# Altium footprint library TO系列封装.PcbLib: 129 footprints (part 3 of 9)
Each footprint in its own frame and in the unit in brackets; x right, y up, seen from the top. Pads: shape width x height; smd on the part's side, far side on the other; paste and mask are expansions set on the pad; w line width, h text height; cw(c..) or ccw(c..) is an arc to the next point about the centre after c.
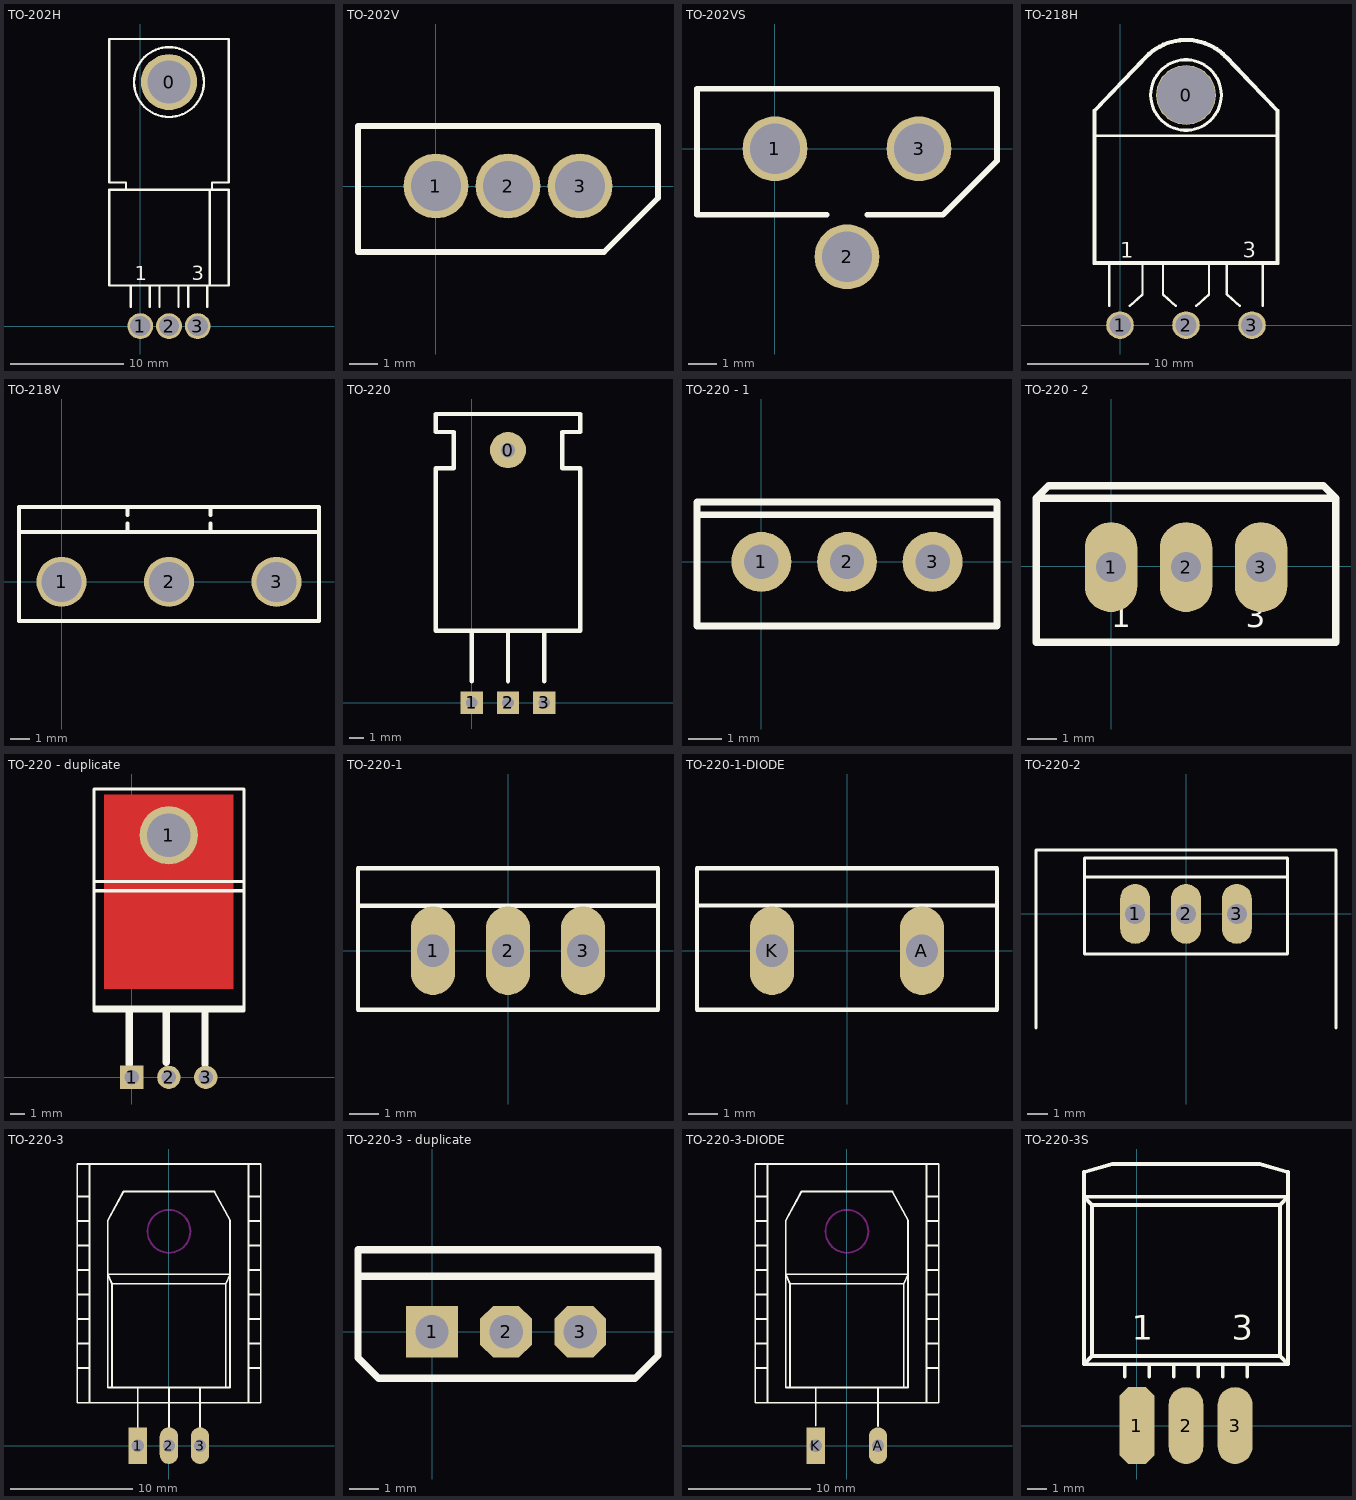
[diagram p2: the footprints below, top view; thin cyan lines are the x and y axes]

## TO-202H [mil]
pads (4):
  round 195 hole 150: 0(100,850)
  round 90 hole 70: 1(0,0) 2(100,0) 3(200,0)
Top Overlay:
  circle w7.87: c100,850 r121.66
  lines w7.87: -50,475 -50,500 -108.33,500 -108.33,1000 308.33,1000 308.33,500 250,500 250,475 ; -33.33,66.93 -33.33,141.67 ; 33.33,66.93 33.33,141.67 ; 66.67,66.93 66.67,141.67 ; 133.33,66.93 133.33,141.67 ; 166.67,66.93 166.67,141.67 ; 233.33,66.93 233.33,141.67 ; 241.67,141.67 241.67,475 ; -108.33,141.67 -108.33,475 308.33,475 308.33,141.67 -108.33,141.67
  text "1" at -20,160 h50
  text "3" at 180,160 h50

## TO-202V [mil]
pads (3):
  round 90 hole 70: 1(0,0) 2(100,0) 3(200,0)
Top Overlay:
  lines w7.87: -108.33,-91.67 233.33,-91.67 308.33,-16.67 308.33,83.33 -108.33,83.33 -108.33,-91.67

## TO-202VS [mil]
pads (3):
  round 90 hole 70: 1(0,0) 2(100,-150) 3(200,0)
Top Overlay:
  lines w7.87: -108.33,-91.67 72.04,-91.67 ; 127.96,-91.67 233.33,-91.67
  lines w8: -108.33,-91.67 -108.33,83.33 308.33,83.33 308.33,-16.67 233.33,-91.67

## TO-218H [mil]
pads (4):
  round 195 hole 190: 0(215,750)
  round 90 hole 70: 1(0,0) 2(215,0) 3(430,0)
Top Overlay:
  circle w10: c215,750 r115
  lines w7.87: -35,62.99 -35,200 ; 31.67,62.99 73.33,100 73.33,200 ; 73.33,866.67 -85,700 -85,616.67 ; 95,880 -80,700 -80,205 510,205 510,700 340,875 ; 140,200 140,100 181.67,62.99 ; 248.33,62.99 290,100 290,200 ; 348.33,200 348.33,100 390,62.99 ; 348.33,875 515,700 515,616.67 ; 465,62.99 465,200 ; -85,616.67 -85,200 515,200 515,616.67 ; -85,616.67 515,616.67
  lines w8: 73.17,864.85 cw(c215,750) 348.47,874.46 ; 94.51,879.21 cw(c215,750) 339.92,874.92
  text "3" at 400,220 h50
  text "1" at 0,220 h50
3D body "User Library-TO218.STEP": height 196.09, standoff 7.11, extent -85,-31.61 505.55,961.61

## TO-218V [mil]
pads (3):
  round 100 hole 80: 1(0,0) 2(215,0) 3(430,0)
Top Overlay:
  lines w7.87: -85,100 515,100 ; 131.67,100 131.67,116.67 ; 131.67,133.33 131.67,150 ; 298.33,100 298.33,116.67 ; 298.33,133.33 298.33,150 ; -85,-78.74 -85,150 515,150 515,-78.74 -85,-78.74
3D body "SW3dPS-TO-218-1.STEP": height 1048.11, standoff -322.98, extent -94.21,-82.91 504.21,110

## TO-220 [mil]
pads (4):
  round 100 hole 40: 0(100,700)
  rect 62x62 hole 32: 1(0,0) 2(100,0) 3(200,0)
Top Overlay:
  lines w12: 0,60 0,200 ; 100,60 100,200 ; 200,60 200,200 ; -100,200 -100,650 -50,650 -50,750 -100,750 -100,800 300,800 300,750 250,750 250,650 300,650 300,200 -100,200
3D body "User Library-TO220 L.STEP": height 177.17, standoff -118.11, extent -98.7,-2.88 295,772.88

## TO-220 - 1 [mil]
pads (3):
  round 70 hole 40: 1(0,0) 2(100,0) 3(200,0)
Top Overlay:
  lines w8: -75,55 275,55 ; -75,-75 -75,70 275,70 275,-75 -75,-75

## TO-220 - 2 [mil]
pads (3):
  oval 70x120 hole 40: 1(0,-1) 2(100,-1) 3(200,-1)
Top Overlay:
  lines w10: -100,90.67 -100,-100.56 -99.56,-101 299.56,-101 300,-100.56 300,90.67 ; -100,90.67 300,90.67 ; -100,90.67 -83.33,107.33 283.33,107.33 300,90.67
  text "3" at 180,-81 h30
  text "1" at 0,-81 h30
3D body "User Library-TO-220-1.STEP": height 740.16, standoff -392.91, extent -93.88,-84 295.88,93.17

## TO-220 - duplicate [mm]
pads (4):
  rect 1.6x1.6 hole 1: 1(0,0)
  round 4 hole 3: 1(2.54,16.637)
  round 1.6 hole 1: 2(2.54,0) 3(5.08,0)
Top Layer:
  rectangle: -1.905,6.071 6.985,19.431
Top Overlay:
  lines w0.22: -2.591,4.699 7.696,4.699 ; -2.591,4.826 7.696,4.826 ; -2.591,12.827 7.696,12.827 ; -2.591,13.462 7.696,13.462 ; -2.591,19.05 -2.591,19.812 7.696,19.812 7.696,4.572 -2.591,4.572 -2.591,19.558
  lines w0.5: -0.178,0.889 -0.178,4.572 ; 2.362,1.016 2.362,4.699 ; 5.029,0.889 5.029,4.572
3D body "User Library-TO220 L.STEP": height 4.5, standoff -3, extent -2.46,-0.254 7.54,19.45
3D body "User Library-TO220 L.STEP": height 4.5, standoff -3, extent -2.638,-0.127 7.362,19.577

## TO-220-1 [mm]
pads (3):
  oval 1.5x3 hole 1.1: 1(-2.54,0) 2(0,0) 3(2.54,0)
Top Overlay:
  lines w0.15: -5.08,1.524 5.08,1.521 ; -5.08,-2 -5.08,2.79 5.08,2.79 5.08,-2 -5.08,-2
3D body "IC1.STEP": height 19.5, standoff -4, extent -5.25,-1.955 5.25,2.745
3D body "User Library-POWER MOSFET, NON-SURFACE-MOUNT.step": height 18.3, standoff -10.08, extent -4.834,-1.996 4.818,2.504

## TO-220-1-DIODE [mm]
pads (2):
  oval 1.5x3 hole 1.1: A(2.54,0) K(-2.54,0)
Top Overlay:
  lines w0.15: -5.08,1.53 5.08,1.53 ; -5.08,-2 -5.08,2.79 5.08,2.79 5.08,-2 -5.08,-2
3D body "IC2.STEP": height 19.5, standoff -4, extent -5.25,-1.955 5.25,2.745

## TO-220-2 [mm]
pads (3):
  oval 1.5x3 hole 1: 1(-2.54,0) 2(0,0) 3(2.54,0)
Top Overlay:
  lines w0.15: -7.5,-5.713 -7.5,3.2 7.5,3.2 7.5,-5.713 ; -5.08,1.848 5.08,1.848 ; -5.08,-2 5.08,-2 5.08,2.79 -5.08,2.79 -5.08,-2
3D body "User Library-Package T0-220AB With Heatsing Vertical Mount-1.STEP": height 20.07, standoff -5.86, extent -8.5,-5.787 8.5,4.433

## TO-220-3 [mm]
pads (3):
  rect 1.5x3 hole 1: 1(-2.54,0)
  oval 1.5x3 hole 1: 2(0,0) 3(2.54,0)
Top Overlay:
  lines w0.15: -7.493,6.343 -6.493,6.343 ; -7.493,8.343 -6.493,8.343 ; -7.493,10.343 -6.493,10.343 ; -7.493,12.343 -6.493,12.343 ; -7.493,14.343 -6.493,14.343 ; -7.493,16.343 -6.493,16.343 ; -7.493,18.343 -6.493,18.343 ; -7.493,20.343 -6.493,20.343 ; -6.493,3.505 -6.493,23.005 ; -5,14 5,14 ; -5,14.005 -4.644,13.217 ; -5,18.377 -5,4.75 5,4.75 5,18.377 ; -5,18.388 -3.712,20.75 3.712,20.75 5,18.388 ; -4.644,4.75 -4.644,13.217 ; -2.54,0 -2.54,4.75 ; 0,0 0,4.75 ; 2.54,0 2.54,4.75 ; 4.644,4.75 4.644,13.217 ; 5,14.005 4.644,13.217 ; 6.507,3.505 6.507,23.005 ; 6.507,6.343 7.507,6.343 ; 6.507,8.343 7.507,8.343 ; 6.507,10.343 7.507,10.343 ; 6.507,12.343 7.507,12.343 ; 6.507,14.343 7.507,14.343 ; 6.507,16.343 7.507,16.343 ; 6.507,18.343 7.507,18.343 ; 6.507,20.343 7.507,20.343 ; -4.644,13.217 4.644,13.217 ; -7.493,3.505 7.507,3.505 7.507,23.005 -7.493,23.005 -7.493,3.505
Keep-Out Layer:
  circle w0.15: c0.007,17.505 r1.75
  circle w0.15: c0,17.5 r1.75
3D body "User Library-TO-220-2.step": height 10.39, standoff -2.31, extent -5.85,-0.325 5.864,21.773

## TO-220-3 - duplicate [mil]
pads (3):
  rect 70x70 hole 45: 1(0,0)
  oct 70x70 hole 45: 2(100,0) 3(200,0)
Top Overlay:
  lines w10: -94,75 302,75 ; -100,-35 -72,-63 274,-63 305,-32 305,111 -100,111 -100,-35
3D body "TO220_3.STEP": height 728.35, standoff -389.76, extent -104.45,-72.17 305,105

## TO-220-3-DIODE [mm]
pads (2):
  oval 1.5x3 hole 1: A(2.54,0)
  rect 1.5x3 hole 1: K(-2.54,0)
Top Overlay:
  lines w0.15: -7.493,6.343 -6.493,6.343 ; -7.493,8.343 -6.493,8.343 ; -7.493,10.343 -6.493,10.343 ; -7.493,12.343 -6.493,12.343 ; -7.493,14.343 -6.493,14.343 ; -7.493,16.343 -6.493,16.343 ; -7.493,18.343 -6.493,18.343 ; -7.493,20.343 -6.493,20.343 ; -6.493,3.505 -6.493,23.005 ; -5,14 5,14 ; -5,14.005 -4.644,13.217 ; -5,18.377 -5,4.75 5,4.75 5,18.377 ; -5,18.388 -3.712,20.75 3.712,20.75 5,18.388 ; -4.644,4.75 -4.644,13.217 ; -2.54,1.654 -2.54,4.75 ; 2.54,1.611 2.54,4.75 ; 4.644,4.75 4.644,13.217 ; 5,14.005 4.644,13.217 ; 6.507,3.505 6.507,23.005 ; 6.507,6.343 7.507,6.343 ; 6.507,8.343 7.507,8.343 ; 6.507,10.343 7.507,10.343 ; 6.507,12.343 7.507,12.343 ; 6.507,14.343 7.507,14.343 ; 6.507,16.343 7.507,16.343 ; 6.507,18.343 7.507,18.343 ; 6.507,20.343 7.507,20.343 ; -4.644,13.217 4.644,13.217 ; -7.493,3.505 7.507,3.505 7.507,23.005 -7.493,23.005 -7.493,3.505
Keep-Out Layer:
  circle w0.15: c0,17.5 r1.75
  circle w0.15: c0.007,17.505 r1.75
3D body "User Library-Disipador TO.step": height 10, standoff 0, extent -8.493,1.491 8.507,21.491

## TO-220-3S [mil]
pads (3):
  oct 70.83x156.67 smd: 1(0,0)
  oval 70.83x156.67 smd: 2(100,0) 3(200,0)
Top Overlay:
  lines w7.87: -25,100 -25,125 ; 25,100 25,125 ; 75,100 75,125 ; 125,100 125,125 ; 175,100 175,125 ; 225,100 225,125 ; -108.33,125 -91.67,141.67 ; -108.33,125 -108.33,466.67 ; -108.33,125 308.33,125 ; -108.33,466.67 -91.67,450 ; -108.33,466.67 -108.33,516.67 -50,533.33 250,533.33 308.33,516.67 308.33,466.67 ; -108.33,466.67 308.33,466.67 ; -91.67,141.67 291.67,141.67 ; -91.67,141.67 -91.67,450 ; -91.67,450 291.67,450 ; 291.67,141.67 308.33,125 ; 291.67,141.67 291.67,450 ; 291.67,450 308.33,466.67 ; 308.33,125 308.33,466.67
  text "1" at -10.26,175.05 h50
  text "3" at 193.03,175.05 h50